# Altium footprint library Tomra_Cadstar_Footprints.PcbLib: 373 footprints (part 13 of 24)
Each footprint in its own frame and in the unit in brackets; x right, y up, seen from the top. Pads: shape width x height; smd on the part's side, far side on the other; paste and mask are expansions set on the pad; w line width, h text height; cw(c..) or ccw(c..) is an arc to the next point about the centre after c.
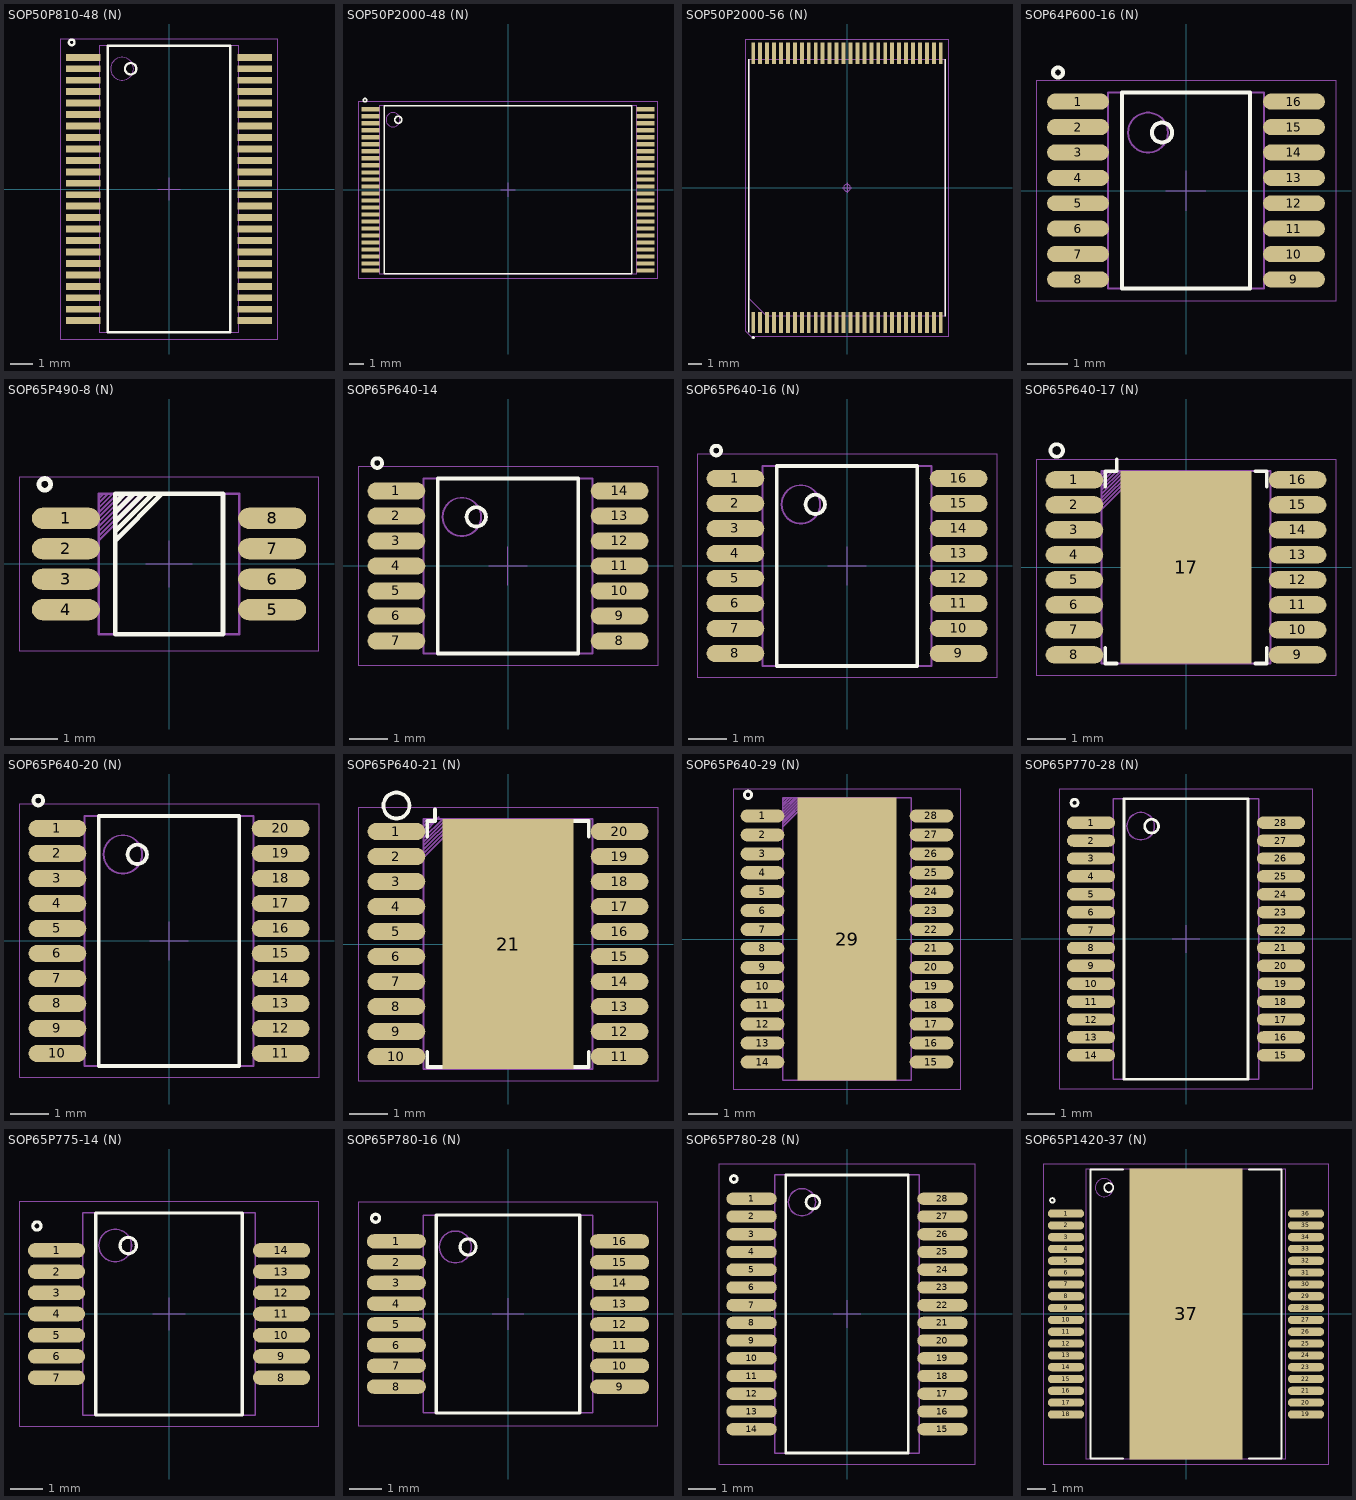
[diagram p12: the footprints below, top view; thin cyan lines are the x and y axes]

## SOP50P810-48 (N) [mm]
height 1.2
pads (48):
  rect 1.5x0.3 smd paste+0 mask+0: 1(-3.75,5.75) 2(-3.75,5.25) 3(-3.75,4.75) 4(-3.75,4.25) 5(-3.75,3.75) 6(-3.75,3.25) 7(-3.75,2.75) 8(-3.75,2.25) 9(-3.75,1.75) 10(-3.75,1.25) 11(-3.75,0.75) 12(-3.75,0.25) 13(-3.75,-0.25) 14(-3.75,-0.75) 15(-3.75,-1.25) 16(-3.75,-1.75) 17(-3.75,-2.25) 18(-3.75,-2.75) 19(-3.75,-3.25) 20(-3.75,-3.75) 21(-3.75,-4.25) 22(-3.75,-4.75) 23(-3.75,-5.25) 24(-3.75,-5.75) 25(3.75,-5.75) 26(3.75,-5.25) 27(3.75,-4.75) 28(3.75,-4.25) 29(3.75,-3.75) 30(3.75,-3.25) 31(3.75,-2.75) 32(3.75,-2.25) 33(3.75,-1.75) 34(3.75,-1.25) 35(3.75,-0.75) 36(3.75,-0.25) 37(3.75,0.25) 38(3.75,0.75) 39(3.75,1.25) 40(3.75,1.75) 41(3.75,2.25) 42(3.75,2.75) 43(3.75,3.25) 44(3.75,3.75) 45(3.75,4.25) 46(3.75,4.75) 47(3.75,5.25) 48(3.75,5.75)
Top Silk:
  lines w0.1: -4.375,6.4 cw(c-4.25,6.4) -4.125,6.4 cw(c-4.25,6.4) -4.375,6.4 ; -2.675,-6.25 2.675,-6.25 2.675,6.25 -2.675,6.25 -2.675,-6.25 ; -1.925,5.25 cw(c-1.675,5.25) -1.425,5.25 cw(c-1.675,5.25) -1.925,5.25
  text ".Designator" at -3.599,-0.35 h0.7
Top Assembly:
  lines w0.05: -3.05,-6.25 3.05,-6.25 3.05,6.25 -3.05,6.25 -3.05,-6.25 ; -2.55,5.25 cw(c-2.05,5.25) -1.55,5.25 cw(c-2.05,5.25) -2.55,5.25
Top Placement:
  lines w0.01: -0.5,0 0.5,0 ; 0,-0.5 0,0.5 ; -4.75,-6.55 4.75,-6.55 4.75,6.55 -4.75,6.55 -4.75,-6.55

## SOP50P2000-48 (N) [mm]
height 1.2
pads (48):
  rect 1.3x0.3 smd paste+0 mask+0: 1(-9.8,5.75) 2(-9.8,5.25) 3(-9.8,4.75) 4(-9.8,4.25) 5(-9.8,3.75) 6(-9.8,3.25) 7(-9.8,2.75) 8(-9.8,2.25) 9(-9.8,1.75) 10(-9.8,1.25) 11(-9.8,0.75) 12(-9.8,0.25) 13(-9.8,-0.25) 14(-9.8,-0.75) 15(-9.8,-1.25) 16(-9.8,-1.75) 17(-9.8,-2.25) 18(-9.8,-2.75) 19(-9.8,-3.25) 20(-9.8,-3.75) 21(-9.8,-4.25) 22(-9.8,-4.75) 23(-9.8,-5.25) 24(-9.8,-5.75) 25(9.8,-5.75) 26(9.8,-5.25) 27(9.8,-4.75) 28(9.8,-4.25) 29(9.8,-3.75) 30(9.8,-3.25) 31(9.8,-2.75) 32(9.8,-2.25) 33(9.8,-1.75) 34(9.8,-1.25) 35(9.8,-0.75) 36(9.8,-0.25) 37(9.8,0.25) 38(9.8,0.75) 39(9.8,1.25) 40(9.8,1.75) 41(9.8,2.25) 42(9.8,2.75) 43(9.8,3.25) 44(9.8,3.75) 45(9.8,4.25) 46(9.8,4.75) 47(9.8,5.25) 48(9.8,5.75)
Top Silk:
  lines w0.1: -10.325,6.4 cw(c-10.2,6.4) -10.075,6.4 cw(c-10.2,6.4) -10.325,6.4 ; -8.825,-6 8.825,-6 8.825,6 -8.825,6 -8.825,-6 ; -8.075,5 cw(c-7.825,5) -7.575,5 cw(c-7.825,5) -8.075,5
  text ".Designator" at -8.825,6 h0.7
Top Assembly:
  lines w0.05: -9.2,-6 9.2,-6 9.2,6 -9.2,6 -9.2,-6 ; -8.7,5 cw(c-8.2,5) -7.7,5 cw(c-8.2,5) -8.7,5
Top Placement:
  lines w0.01: -0.5,0 0.5,0 ; 0,-0.5 0,0.5 ; -10.7,-6.3 10.7,-6.3 10.7,6.3 -10.7,6.3 -10.7,-6.3

## SOP50P2000-56 (N) [mm]
height 1.2
pads (56):
  rect 0.28x1.54 smd paste+0 mask+0: 1(-6.75,-9.69) 2(-6.25,-9.69) 3(-5.75,-9.69) 4(-5.25,-9.69) 5(-4.75,-9.69) 6(-4.25,-9.69) 7(-3.75,-9.69) 8(-3.25,-9.69) 9(-2.75,-9.69) 10(-2.25,-9.69) 11(-1.75,-9.69) 12(-1.25,-9.69) 13(-0.75,-9.69) 14(-0.25,-9.69) 15(0.25,-9.69) 16(0.75,-9.69) 17(1.25,-9.69) 18(1.75,-9.69) 19(2.25,-9.69) 20(2.75,-9.69) 21(3.25,-9.69) 22(3.75,-9.69) 23(4.25,-9.69) 24(4.75,-9.69) 25(5.25,-9.69) 26(5.75,-9.69) 27(6.25,-9.69) 28(6.75,-9.69) 29(6.75,9.69) 30(6.25,9.69) 31(5.75,9.69) 32(5.25,9.69) 33(4.75,9.69) 34(4.25,9.69) 35(3.75,9.69) 36(3.25,9.69) 37(2.75,9.69) 38(2.25,9.69) 39(1.75,9.69) 40(1.25,9.69) 41(0.75,9.69) 42(0.25,9.69) 43(-0.25,9.69) 44(-0.75,9.69) 45(-1.25,9.69) 46(-1.75,9.69) 47(-2.25,9.69) 48(-2.75,9.69) 49(-3.25,9.69) 50(-3.75,9.69) 51(-4.25,9.69) 52(-4.75,9.69) 53(-5.25,9.69) 54(-5.75,9.69) 55(-6.25,9.69) 56(-6.75,9.69)
Top Silk:
  region: -6.85,-10.78 -6.85,-10.739 -6.791,-10.68 -6.709,-10.68 -6.65,-10.739 -6.65,-10.78 -6.65,-10.821 -6.709,-10.88 -6.791,-10.88 -6.85,-10.821
  lines w0.1: -7.07,-10.4 -7.07,9.25 ; 7.07,-9.25 7.07,9.25
  text ".Designator" at 0,0 h0.7
Top Assembly:
  lines w0.05: -7.05,-7.98 -5.78,-9.25 7.05,-9.25 7.05,9.25 -7.05,9.25 -7.05,-7.98
Top Placement:
  lines w0.01: -7.3,-10.31 -6.9,-10.71 7.3,-10.71 7.3,10.71 -7.3,10.71 -7.3,-10.31
  lines w0.05: -0.35,0 0.35,0 ; 0,-0.35 0,0.35 ; -0.25,0 cw(c0,0) 0.25,0 cw(c0,0) -0.25,0

## SOP64P600-16 (N) [mm]
height 1.75
pads (16):
  oval 1.55x0.4 smd paste+0 mask+0: 1(-2.7,2.222) 2(-2.7,1.587) 3(-2.7,0.953) 4(-2.7,0.318) 5(-2.7,-0.318) 6(-2.7,-0.953) 7(-2.7,-1.587) 8(-2.7,-2.222) 9(2.7,-2.222) 10(2.7,-1.587) 11(2.7,-0.953) 12(2.7,-0.318) 13(2.7,0.318) 14(2.7,0.953) 15(2.7,1.587) 16(2.7,2.222)
Top Silk:
  lines w0.1: -3.325,2.95 cw(c-3.2,2.95) -3.075,2.95 cw(c-3.2,2.95) -3.325,2.95 ; -1.6,-2.45 1.6,-2.45 1.6,2.45 -1.6,2.45 -1.6,-2.45 ; -0.85,1.45 cw(c-0.6,1.45) -0.35,1.45 cw(c-0.6,1.45) -0.85,1.45
  text ".Designator" at -3.599,-0.35 h0.7
Top Assembly:
  lines w0.05: -1.95,-2.448 1.95,-2.448 1.95,2.447 -1.95,2.447 -1.95,-2.448 ; -1.45,1.448 cw(c-0.95,1.448) -0.45,1.448 cw(c-0.95,1.448) -1.45,1.448
Top Placement:
  lines w0.01: -0.5,0 0.5,0 ; 0,-0.5 0,0.5 ; -3.75,-2.75 3.75,-2.75 3.75,2.75 -3.75,2.75 -3.75,-2.75

## SOP65P490-8 (N) [mm]
height 0.95
pads (8):
  oval 1.45x0.45 smd paste+0 mask+0: 1(-2.2,0.975) 2(-2.2,0.325) 3(-2.2,-0.325) 4(-2.2,-0.975) 5(2.2,-0.975) 6(2.2,-0.325) 7(2.2,0.325) 8(2.2,0.975)
Top Silk:
  lines w0.1: -1.15,0.5 -0.15,1.5 ; -1.15,0.7 -0.35,1.5 ; -1.15,0.9 -0.55,1.5 ; -1.15,1.1 -0.75,1.5 ; -1.15,1.3 -0.95,1.5 ; -2.775,1.7 cw(c-2.65,1.7) -2.525,1.7 cw(c-2.65,1.7) -2.775,1.7 ; -1.15,-1.5 1.15,-1.5 1.15,1.5 -1.15,1.5 -1.15,-1.5
  text ".Designator" at -3.599,-0.35 h0.7
Top Assembly:
  lines w0.05: -1.5,0.5 -0.5,1.5 ; -1.5,0.6 -0.6,1.5 ; -1.5,0.7 -0.7,1.5 ; -1.5,0.8 -0.8,1.5 ; -1.5,0.9 -0.9,1.5 ; -1.5,1 -1,1.5 ; -1.5,1.1 -1.1,1.5 ; -1.5,1.2 -1.2,1.5 ; -1.5,1.3 -1.3,1.5 ; -1.5,1.4 -1.4,1.5 ; -1.5,-1.5 -1.5,1.5 1.5,1.5 1.5,-1.5 -1.5,-1.5
Top Placement:
  lines w0.01: -0.5,0 0.5,0 ; 0,-0.5 0,0.5 ; -3.2,-1.85 3.2,-1.85 3.2,1.85 -3.2,1.85 -3.2,-1.85

## SOP65P640-14 [mm]
height 1.1
pads (14):
  oval 1.5x0.45 smd paste+0 mask+0: 1(-2.9,1.95) 2(-2.9,1.3) 3(-2.9,0.65) 4(-2.9,0) 5(-2.9,-0.65) 6(-2.9,-1.3) 7(-2.9,-1.95) 8(2.9,-1.95) 9(2.9,-1.3) 10(2.9,-0.65) 11(2.9,0) 12(2.9,0.65) 13(2.9,1.3) 14(2.9,1.95)
Top Silk:
  lines w0.1: -3.525,2.675 cw(c-3.4,2.675) -3.275,2.675 cw(c-3.4,2.675) -3.525,2.675 ; -1.825,-2.275 1.825,-2.275 1.825,2.275 -1.825,2.275 -1.825,-2.275 ; -1.075,1.275 cw(c-0.825,1.275) -0.575,1.275 cw(c-0.825,1.275) -1.075,1.275
  text ".Designator" at -3.594,-0.35 h0.7
Top Assembly:
  lines w0.05: -2.2,-2.275 2.2,-2.275 2.2,2.275 -2.2,2.275 -2.2,-2.275 ; -1.7,1.275 cw(c-1.2,1.275) -0.7,1.275 cw(c-1.2,1.275) -1.7,1.275
Top Placement:
  lines w0.01: -0.505,0 0.495,0 ; -0.005,-0.5 -0.005,0.5 ; -3.9,-2.58 3.9,-2.58 3.9,2.575 -3.9,2.575 -3.9,-2.58

## SOP65P640-16 (N) [mm]
height 1.5
pads (16):
  oval 1.5x0.45 smd paste+0 mask+0: 1(-2.9,2.275) 2(-2.9,1.625) 3(-2.9,0.975) 4(-2.9,0.325) 5(-2.9,-0.325) 6(-2.9,-0.975) 7(-2.9,-1.625) 8(-2.9,-2.275) 9(2.9,-2.275) 10(2.9,-1.625) 11(2.9,-0.975) 12(2.9,-0.325) 13(2.9,0.325) 14(2.9,0.975) 15(2.9,1.625) 16(2.9,2.275)
Top Silk:
  lines w0.1: -3.525,3 cw(c-3.4,3) -3.275,3 cw(c-3.4,3) -3.525,3 ; -1.825,-2.6 1.825,-2.6 1.825,2.6 -1.825,2.6 -1.825,-2.6 ; -1.075,1.6 cw(c-0.825,1.6) -0.575,1.6 cw(c-0.825,1.6) -1.075,1.6
  text ".Designator" at -3.599,-0.35 h0.7
Top Assembly:
  lines w0.05: -2.2,-2.6 2.2,-2.6 2.2,2.6 -2.2,2.6 -2.2,-2.6 ; -1.7,1.6 cw(c-1.2,1.6) -0.7,1.6 cw(c-1.2,1.6) -1.7,1.6
Top Placement:
  lines w0.01: -0.5,0 0.5,0 ; 0,-0.5 0,0.5 ; -3.9,-2.9 3.9,-2.9 3.9,2.9 -3.9,2.9 -3.9,-2.9

## SOP65P640-17 (N) [mm]
height 1.2
pads (17):
  oval 1.5x0.45 smd paste+0 mask+0: 1(-2.9,2.275) 2(-2.9,1.625) 3(-2.9,0.975) 4(-2.9,0.325) 5(-2.9,-0.325) 6(-2.9,-0.975) 7(-2.9,-1.625) 8(-2.9,-2.275) 9(2.9,-2.275) 10(2.9,-1.625) 11(2.9,-0.975) 12(2.9,-0.325) 13(2.9,0.325) 14(2.9,0.975) 15(2.9,1.625) 16(2.9,2.275)
  rect 3.4x5 smd paste+0 mask+0: 17(0,0)
Top Silk:
  lines w0.1: -2.1,2.1 -2.1,2.5 -1.8,2.5 -1.8,2.8 ; 1.8,-2.5 2.1,-2.5 2.1,-2.1 ; 1.8,2.5 2.1,2.5 2.1,2.1 ; -2.1,-2.5 -1.8,-2.5 -2.1,-2.5 ; -2.1,-2.5 -2.1,-2.1 -2.1,-2.5 ; -3.525,3.037 cw(c-3.363,3.037) -3.2,3.037 cw(c-3.363,3.037) -3.525,3.037
  text ".Designator" at -3.599,-0.35 h0.7
Top Assembly:
  lines w0.05: -2.2,1.5 -1.2,2.5 ; -2.2,1.6 -1.3,2.5 ; -2.2,1.7 -1.4,2.5 ; -2.2,1.8 -1.5,2.5 ; -2.2,1.9 -1.6,2.5 ; -2.2,2 -1.7,2.5 ; -2.2,2.1 -1.8,2.5 ; -2.2,2.2 -1.9,2.5 ; -2.2,2.3 -2,2.5 ; -2.2,2.4 -2.1,2.5 ; -2.2,-2.5 2.2,-2.5 2.2,2.5 -2.2,2.5 -2.2,-2.5
Top Placement:
  lines w0.01: -0.5,0 0.5,0 ; 0,-0.5 0,0.5 ; -3.9,-2.8 3.9,-2.8 3.9,2.8 -3.9,2.8 -3.9,-2.8

## SOP65P640-20 (N) [mm]
height 1.5
pads (20):
  oval 1.5x0.45 smd paste+0 mask+0: 1(-2.9,2.925) 2(-2.9,2.275) 3(-2.9,1.625) 4(-2.9,0.975) 5(-2.9,0.325) 6(-2.9,-0.325) 7(-2.9,-0.975) 8(-2.9,-1.625) 9(-2.9,-2.275) 10(-2.9,-2.925) 11(2.9,-2.925) 12(2.9,-2.275) 13(2.9,-1.625) 14(2.9,-0.975) 15(2.9,-0.325) 16(2.9,0.325) 17(2.9,0.975) 18(2.9,1.625) 19(2.9,2.275) 20(2.9,2.925)
Top Silk:
  lines w0.1: -3.525,3.65 cw(c-3.4,3.65) -3.275,3.65 cw(c-3.4,3.65) -3.525,3.65 ; -1.825,-3.25 1.825,-3.25 1.825,3.25 -1.825,3.25 -1.825,-3.25 ; -1.075,2.25 cw(c-0.825,2.25) -0.575,2.25 cw(c-0.825,2.25) -1.075,2.25
  text ".Designator" at -3.599,-0.35 h0.7
Top Assembly:
  lines w0.05: -2.2,-3.25 2.2,-3.25 2.2,3.25 -2.2,3.25 -2.2,-3.25 ; -1.7,2.25 cw(c-1.2,2.25) -0.7,2.25 cw(c-1.2,2.25) -1.7,2.25
Top Placement:
  lines w0.01: -0.5,0 0.5,0 ; 0,-0.5 0,0.5 ; -3.9,-3.55 3.9,-3.55 3.9,3.55 -3.9,3.55 -3.9,-3.55

## SOP65P640-21 (N) [mm]
height 1.2
pads (21):
  oval 1.5x0.45 smd paste+0 mask+0: 1(-2.9,2.925) 2(-2.9,2.275) 3(-2.9,1.625) 4(-2.9,0.975) 5(-2.9,0.325) 6(-2.9,-0.325) 7(-2.9,-0.975) 8(-2.9,-1.625) 9(-2.9,-2.275) 10(-2.9,-2.925) 11(2.9,-2.925) 12(2.9,-2.275) 13(2.9,-1.625) 14(2.9,-0.975) 15(2.9,-0.325) 16(2.9,0.325) 17(2.9,0.975) 18(2.9,1.625) 19(2.9,2.275) 20(2.9,2.925)
  rect 3.4x6.5 smd paste+0 mask+0: 21(0,0)
Top Silk:
  lines w0.1: -2.1,-2.8 -2.1,-3.2 -1.7,-3.2 ; -2.1,2.8 -2.1,3.2 -1.9,3.2 -1.9,3.5 ; 1.7,-3.2 2.1,-3.2 2.1,-2.8 ; 1.7,3.2 2.1,3.2 2.1,2.8 ; -3.238,3.6 cw(c-2.9,3.6) -2.563,3.6 cw(c-2.9,3.6) -3.238,3.6
  text ".Designator" at -3.599,-0.35 h0.7
Top Assembly:
  lines w0.05: -2.2,2.25 -1.2,3.25 ; -2.2,2.35 -1.3,3.25 ; -2.2,2.45 -1.4,3.25 ; -2.2,2.55 -1.5,3.25 ; -2.2,2.65 -1.6,3.25 ; -2.2,2.75 -1.7,3.25 ; -2.2,2.85 -1.8,3.3 ; -2.2,2.95 -1.9,3.25 ; -2.2,3.05 -2,3.25 ; -2.2,3.15 -2.1,3.25 ; -2.2,-3.25 2.2,-3.25 2.2,3.25 -2.2,3.25 -2.2,-3.25
Top Placement:
  lines w0.01: -0.5,0 0.5,0 ; 0,-0.5 0,0.5 ; -3.9,-3.55 3.9,-3.55 3.9,3.55 -3.9,3.55 -3.9,-3.55

## SOP65P640-29 (N) [mm]
height 1.2
pads (29):
  oval 1.5x0.45 smd paste+0 mask+0: 1(-2.9,4.225) 2(-2.9,3.575) 3(-2.9,2.925) 4(-2.9,2.275) 5(-2.9,1.625) 6(-2.9,0.975) 7(-2.9,0.325) 8(-2.9,-0.325) 9(-2.9,-0.975) 10(-2.9,-1.625) 11(-2.9,-2.275) 12(-2.9,-2.925) 13(-2.9,-3.575) 14(-2.9,-4.225) 15(2.9,-4.225) 16(2.9,-3.575) 17(2.9,-2.925) 18(2.9,-2.275) 19(2.9,-1.625) 20(2.9,-0.975) 21(2.9,-0.325) 22(2.9,0.325) 23(2.9,0.975) 24(2.9,1.625) 25(2.9,2.275) 26(2.9,2.925) 27(2.9,3.575) 28(2.9,4.225)
  rect 3.4x9.7 smd paste+0 mask+0: 29(0,0)
Top Silk:
  lines w0.1: -3.525,4.95 cw(c-3.4,4.95) -3.275,4.95 cw(c-3.4,4.95) -3.525,4.95
  text ".Designator" at -3.599,-0.35 h0.7
Top Assembly:
  lines w0.05: -2.2,3.85 -1.2,4.85 ; -2.2,3.95 -1.3,4.85 ; -2.2,4.05 -1.4,4.85 ; -2.2,4.15 -1.5,4.85 ; -2.2,4.25 -1.6,4.85 ; -2.2,4.35 -1.7,4.85 ; -2.2,4.45 -1.8,4.85 ; -2.2,4.55 -1.9,4.85 ; -2.2,4.65 -2,4.85 ; -2.2,4.75 -2.1,4.85 ; -2.2,-4.85 2.2,-4.85 2.2,4.85 -2.2,4.85 -2.2,-4.85
Top Placement:
  lines w0.01: -0.5,0 0.5,0 ; 0,-0.5 0,0.5 ; -3.9,-5.15 3.9,-5.15 3.9,5.15 -3.9,5.15 -3.9,-5.15

## SOP65P770-28 (N) [mm]
height 2
pads (28):
  oval 1.75x0.45 smd paste+0 mask+0: 1(-3.45,4.225) 2(-3.45,3.575) 3(-3.45,2.925) 4(-3.45,2.275) 5(-3.45,1.625) 6(-3.45,0.975) 7(-3.45,0.325) 8(-3.45,-0.325) 9(-3.45,-0.975) 10(-3.45,-1.625) 11(-3.45,-2.275) 12(-3.45,-2.925) 13(-3.45,-3.575) 14(-3.45,-4.225) 15(3.45,-4.225) 16(3.45,-3.575) 17(3.45,-2.925) 18(3.45,-2.275) 19(3.45,-1.625) 20(3.45,-0.975) 21(3.45,-0.325) 22(3.45,0.325) 23(3.45,0.975) 24(3.45,1.625) 25(3.45,2.275) 26(3.45,2.925) 27(3.45,3.575) 28(3.45,4.225)
Top Silk:
  lines w0.1: -4.175,4.95 cw(c-4.05,4.95) -3.925,4.95 cw(c-4.05,4.95) -4.175,4.95 ; -2.25,-5.1 2.25,-5.1 2.25,5.1 -2.25,5.1 -2.25,-5.1 ; -1.5,4.1 cw(c-1.25,4.1) -1,4.1 cw(c-1.25,4.1) -1.5,4.1
  text ".Designator" at -3.599,-0.35 h0.7
Top Assembly:
  lines w0.05: -2.645,-5.1 2.645,-5.1 2.645,5.1 -2.645,5.1 -2.645,-5.1 ; -2.145,4.1 cw(c-1.645,4.1) -1.145,4.1 cw(c-1.645,4.1) -2.145,4.1
Top Placement:
  lines w0.01: -0.5,0 0.5,0 ; 0,-0.5 0,0.5 ; -4.6,-5.45 4.6,-5.45 4.6,5.45 -4.6,5.45 -4.6,-5.45

## SOP65P775-14 (N) [mm]
height 2
pads (14):
  oval 1.75x0.45 smd paste+0 mask+0: 1(-3.45,1.95) 2(-3.45,1.3) 3(-3.45,0.65) 4(-3.45,0) 5(-3.45,-0.65) 6(-3.45,-1.3) 7(-3.45,-1.95) 8(3.45,-1.95) 9(3.45,-1.3) 10(3.45,-0.65) 11(3.45,0) 12(3.45,0.65) 13(3.45,1.3) 14(3.45,1.95)
Top Silk:
  lines w0.1: -4.175,2.7 cw(c-4.05,2.7) -3.925,2.7 cw(c-4.05,2.7) -4.175,2.7 ; -2.25,-3.1 2.25,-3.1 2.25,3.1 -2.25,3.1 -2.25,-3.1 ; -1.5,2.1 cw(c-1.25,2.1) -1,2.1 cw(c-1.25,2.1) -1.5,2.1
  text ".Designator" at -3.599,-0.35 h0.7
Top Assembly:
  lines w0.05: -2.65,-3.1 2.65,-3.1 2.65,3.1 -2.65,3.1 -2.65,-3.1 ; -2.15,2.1 cw(c-1.65,2.1) -1.15,2.1 cw(c-1.65,2.1) -2.15,2.1
Top Placement:
  lines w0.01: -0.5,0 0.5,0 ; 0,-0.5 0,0.5 ; -4.6,-3.45 4.6,-3.45 4.6,3.45 -4.6,3.45 -4.6,-3.45

## SOP65P780-16 (N) [mm]
height 2
pads (16):
  oval 1.85x0.45 smd paste+0 mask+0: 1(-3.5,2.275) 2(-3.5,1.625) 3(-3.5,0.975) 4(-3.5,0.325) 5(-3.5,-0.325) 6(-3.5,-0.975) 7(-3.5,-1.625) 8(-3.5,-2.275) 9(3.5,-2.275) 10(3.5,-1.625) 11(3.5,-0.975) 12(3.5,-0.325) 13(3.5,0.325) 14(3.5,0.975) 15(3.5,1.625) 16(3.5,2.275)
Top Silk:
  lines w0.1: -4.275,3 cw(c-4.15,3) -4.025,3 cw(c-4.15,3) -4.275,3 ; -2.25,-3.1 2.25,-3.1 2.25,3.1 -2.25,3.1 -2.25,-3.1 ; -1.5,2.1 cw(c-1.25,2.1) -1,2.1 cw(c-1.25,2.1) -1.5,2.1
  text ".Designator" at -3.599,-0.35 h0.7
Top Assembly:
  lines w0.05: -2.65,-3.1 2.65,-3.1 2.65,3.1 -2.65,3.1 -2.65,-3.1 ; -2.15,2.1 cw(c-1.65,2.1) -1.15,2.1 cw(c-1.65,2.1) -2.15,2.1
Top Placement:
  lines w0.01: -0.5,0 0.5,0 ; 0,-0.5 0,0.5 ; -4.7,-3.5 4.7,-3.5 4.7,3.5 -4.7,3.5 -4.7,-3.5

## SOP65P780-28 (N) [mm]
height 2
pads (28):
  oval 1.85x0.45 smd paste+0 mask+0: 1(-3.5,4.225) 2(-3.5,3.575) 3(-3.5,2.925) 4(-3.5,2.275) 5(-3.5,1.625) 6(-3.5,0.975) 7(-3.5,0.325) 8(-3.5,-0.325) 9(-3.5,-0.975) 10(-3.5,-1.625) 11(-3.5,-2.275) 12(-3.5,-2.925) 13(-3.5,-3.575) 14(-3.5,-4.225) 15(3.5,-4.225) 16(3.5,-3.575) 17(3.5,-2.925) 18(3.5,-2.275) 19(3.5,-1.625) 20(3.5,-0.975) 21(3.5,-0.325) 22(3.5,0.325) 23(3.5,0.975) 24(3.5,1.625) 25(3.5,2.275) 26(3.5,2.925) 27(3.5,3.575) 28(3.5,4.225)
Top Silk:
  lines w0.1: -4.275,4.95 cw(c-4.15,4.95) -4.025,4.95 cw(c-4.15,4.95) -4.275,4.95 ; -2.25,-5.1 2.25,-5.1 2.25,5.1 -2.25,5.1 -2.25,-5.1 ; -1.5,4.1 cw(c-1.25,4.1) -1,4.1 cw(c-1.25,4.1) -1.5,4.1
  text ".Designator" at -2.65,5.1 h0.7
Top Assembly:
  lines w0.05: -2.65,-5.1 2.65,-5.1 2.65,5.1 -2.65,5.1 -2.65,-5.1 ; -2.15,4.1 cw(c-1.65,4.1) -1.15,4.1 cw(c-1.65,4.1) -2.15,4.1
Top Placement:
  lines w0.01: -0.5,0 0.5,0 ; 0,-0.5 0,0.5 ; -4.7,-5.5 4.7,-5.5 4.7,5.5 -4.7,5.5 -4.7,-5.5

## SOP65P1420-37 (N) [mm]
height 3.6
pads (37):
  oval 2x0.45 smd paste+0 mask+0: 1(-6.6,5.525) 2(-6.6,4.875) 3(-6.6,4.225) 4(-6.6,3.575) 5(-6.6,2.925) 6(-6.6,2.275) 7(-6.6,1.625) 8(-6.6,0.975) 9(-6.6,0.325) 10(-6.6,-0.325) 11(-6.6,-0.975) 12(-6.6,-1.625) 13(-6.6,-2.275) 14(-6.6,-2.925) 15(-6.6,-3.575) 16(-6.6,-4.225) 17(-6.6,-4.875) 18(-6.6,-5.525) 19(6.6,-5.525) 20(6.6,-4.875) 21(6.6,-4.225) 22(6.6,-3.575) 23(6.6,-2.925) 24(6.6,-2.275) 25(6.6,-1.625) 26(6.6,-0.975) 27(6.6,-0.325) 28(6.6,0.325) 29(6.6,0.975) 30(6.6,1.625) 31(6.6,2.275) 32(6.6,2.925) 33(6.6,3.575) 34(6.6,4.225) 35(6.6,4.875) 36(6.6,5.525)
  rect 6.2x16 smd paste+0 mask+0: 37(0,0)
Top Silk:
  lines w0.1: -3.45,-7.95 -5.25,-7.95 -5.25,7.95 -3.45,7.95 ; 3.45,-7.95 5.25,-7.95 5.25,7.95 3.45,7.95 ; -7.475,6.25 cw(c-7.35,6.25) -7.225,6.25 cw(c-7.35,6.25) -7.475,6.25 ; -4.5,6.95 cw(c-4.25,6.95) -4,6.95 cw(c-4.25,6.95) -4.5,6.95
  text ".Designator" at -7.85,8.25 h0.7
Top Assembly:
  lines w0.05: -5.5,-7.95 5.5,-7.95 5.5,7.95 -5.5,7.95 -5.5,-7.95 ; -5,6.95 cw(c-4.5,6.95) -4,6.95 cw(c-4.5,6.95) -5,6.95
Top Placement:
  lines w0.01: -0.5,0 0.5,0 ; 0,-0.5 0,0.5 ; -7.85,-8.25 7.85,-8.25 7.85,8.25 -7.85,8.25 -7.85,-8.25